# Altium integrated library Transformers.IntLib: 12 symbols
Pins are listed as number, name and electrical type; pins without a type are passive.

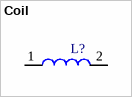
[diagram p0: symbol Coil]

## Coil
designator L?
footprint Coil_drosel
footprint 30A_10uH
footprint NR4030
pins: 1, 2


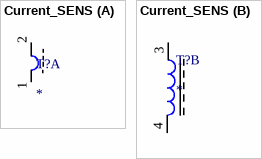
[diagram p1: symbol Current_SENS]

## Current_SENS
designator T?
footprint Current_SENS
footprint Current_Sense_13x7x5
footprint CURRENT_SENS_Case
part A pins: 1 3, 2 4
part B pins: 3, 4


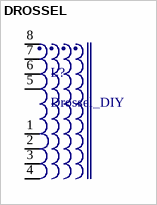
[diagram p2: symbol DROSSEL]

## DROSSEL
designator L?, comment Drossel_DIY
Drosel; PartNumber: 750311457; Manufacturer: Wuerth Elektronik; Ui: 36V; ComponentLink1Description: Manufacturer URL; ComponentLink2Description: Datasheet; ComponentLink1URL: http://www.we-online.com; PackageReference: EP13; ComponentLink2URL: http://katalog.we-online.de/pbs/datasheet/750311457.pdf
footprint Drossel
footprint 30A_10uH
pins: 1, 2, 3, 4, 5, 6, 7, 8


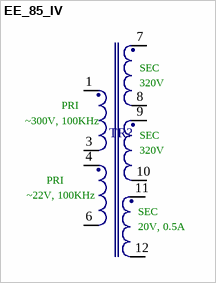
[diagram p3: symbol EE_85_IV]

## EE_85_IV
designator TR?, comment EE85  (value not drawn)
footprint EE85_Ferrite_Core
pins: 1, 3, 4, 6, 7, 8, 9, 10, 11, 12
text: SEC; 320V; PRI; ~300V, 100KHz; ~22V, 100KHz; 20V, 0.5A


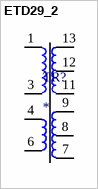
[diagram p4: symbol ETD29_2]

## ETD29_2
designator TR?
footprint TRANS_ETD_29
footprint ETD29_Transformer
footprint ETD29_Transformer_2
pins: 1, 3, 4, 6, 7, 8, 9, 11, 12, 13


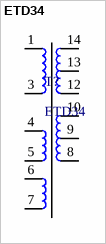
[diagram p5: symbol ETD34]

## ETD34
designator T?
footprint Transformer_ETD34
pins: 1, 3, 4, 5, 6, 7, 8, 9, 10, 12, 13, 14


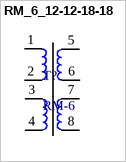
[diagram p6: symbol RM_6_12-12-18-18]

## RM_6_12-12-18-18
designator T?, comment RM-6
footprint TRANS_RM6
pins: 1, 2, 3, 4, 5, 6, 7, 8


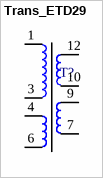
[diagram p7: symbol Trans_ETD29]

## Trans_ETD29
designator T?, comment ETD29  (value not drawn)
footprint TRANS_ETD_29
footprint ETD29_Transformer_2
pins: 1, 3, 4, 6, 7, 9, 10, 12


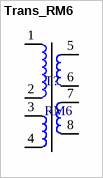
[diagram p8: symbol Trans_RM6]

## Trans_RM6
designator T?, comment RM6
footprint TRANS_RM6
pins: 1, 2, 3, 4, 5, 6, 7, 8


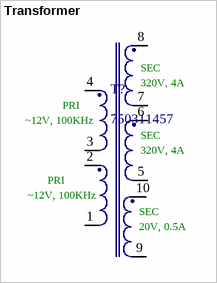
[diagram p9: symbol Transformer]

## Transformer
designator T?, comment 750311457
Transformer; Manufacturer: Wuerth Elektronik; Ui: 36V; ComponentLink1Description: Manufacturer URL; ComponentLink2Description: Datasheet; ComponentLink1URL: http://www.we-online.com; PartNumber: 750311457; PackageReference: EP13; ComponentLink2URL: http://katalog.we-online.de/pbs/datasheet/750311457.pdf
footprint Transformer
footprint EE85_Ferrite_Core
pins: 1, 2, 3, 4, 5, 6, 7, 8, 9, 10
text: SEC; 320V, 4A; PRI; ~12V, 100KHz; 20V, 0.5A


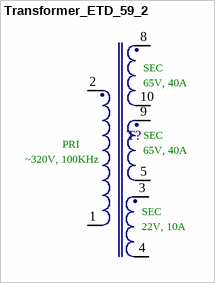
[diagram p10: symbol Transformer_ETD_59_2]

## Transformer_ETD_59_2
designator T?, comment ETD-59_2  (value not drawn)
footprint Transformer_ETD59_2
pins: 1, 2, 3, 4, 5, 8, 9, 10
text: SEC; 65V, 40A; PRI; ~320V, 100KHz; 22V, 10A


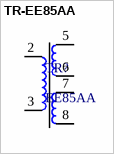
[diagram p11: symbol TR-EE85AA]

## TR-EE85AA
designator TR?, comment EE85AA
footprint EE84AA Hor
pins: 2, 3, 5, 6, 7, 8